# Altium footprint library LukaLIBRARY.PcbLib: 772 footprints (part 14 of 49)
Each footprint in its own frame and in the unit in brackets; x right, y up, seen from the top. Pads: shape width x height; smd on the part's side, far side on the other; paste and mask are expansions set on the pad; w line width, h text height; cw(c..) or ccw(c..) is an arc to the next point about the centre after c.
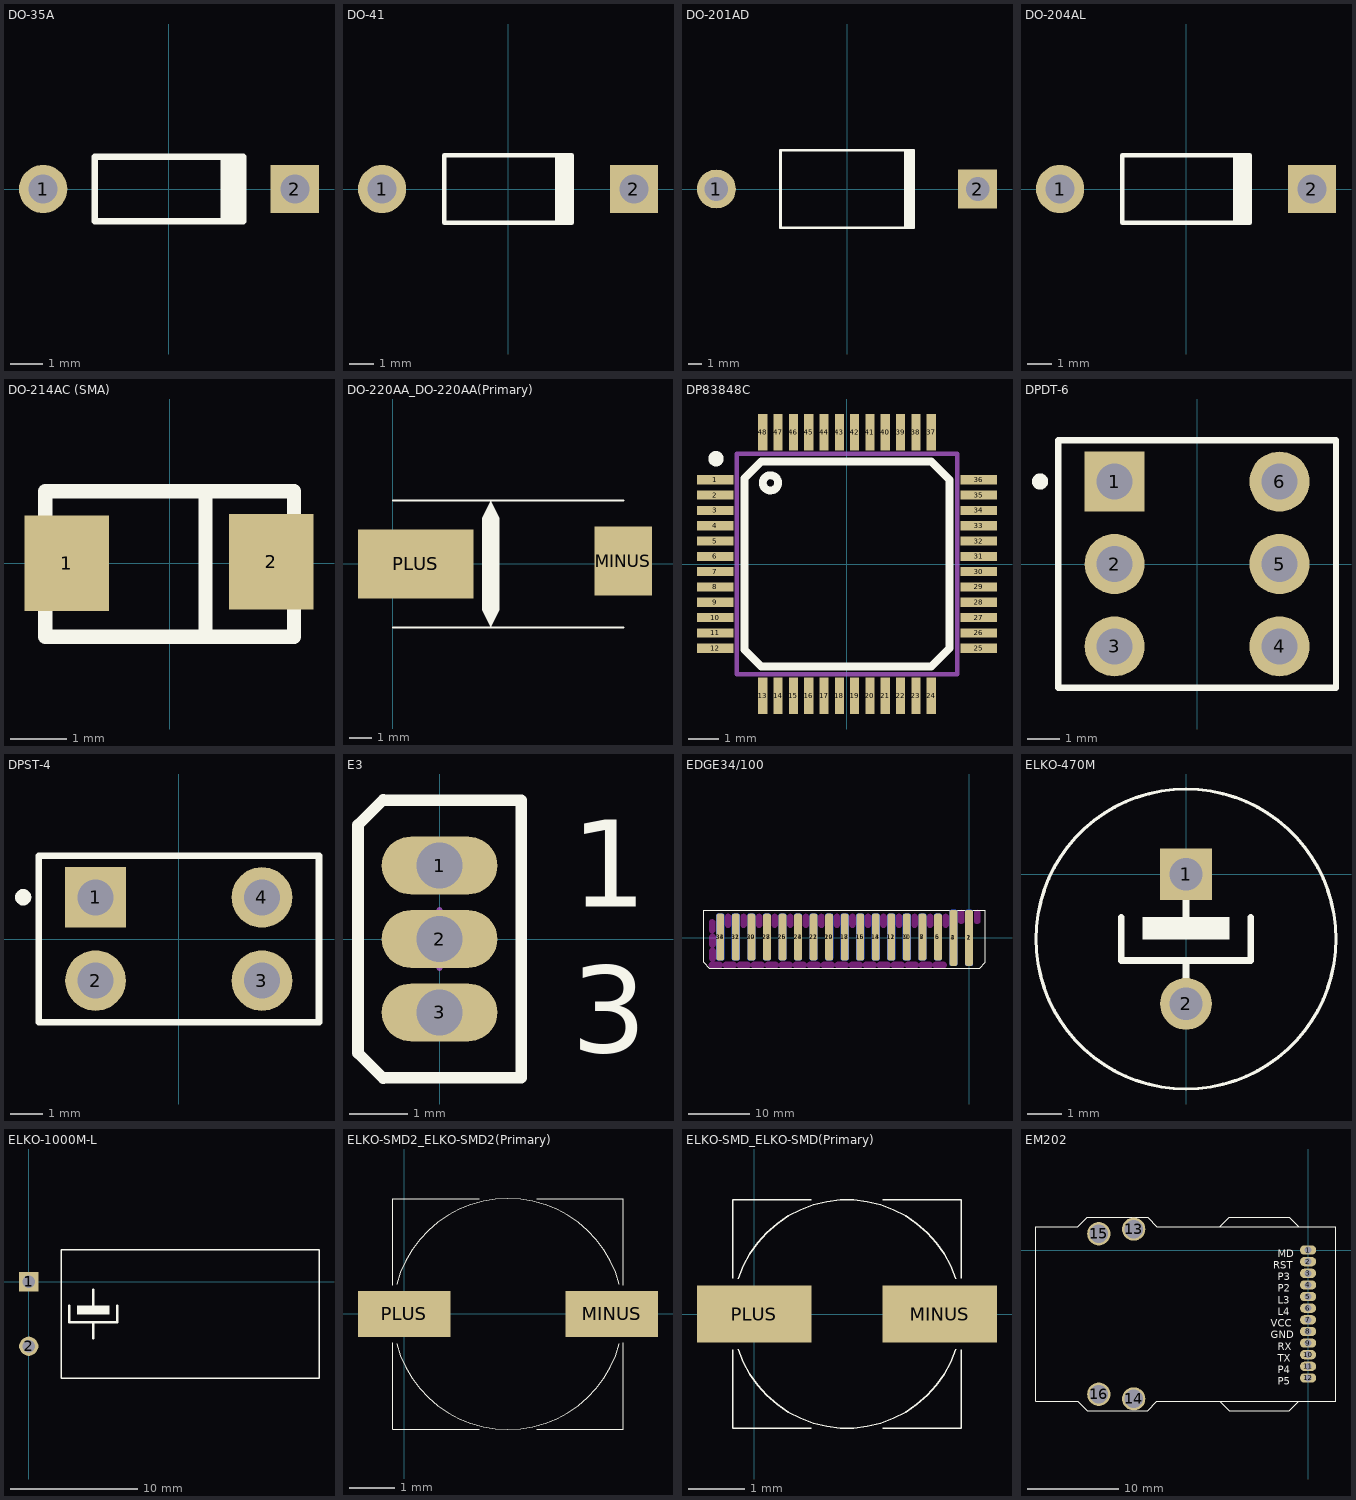
[diagram p13: the footprints below, top view; thin cyan lines are the x and y axes]

## DO-35A [mm] "Diode, Axial; Body 4.6 x 1.9 mm (LxDia. max), Lead Dia. 0.53 mm (max)"
height 2
pads (2):
  round 1.5 hole 0.9: 1(-3.9,0)
  rect 1.5x1.5 hole 0.9: 2(3.9,0)
Top Overlay:
  rectangle: 1.6,-1 2.4,1
  lines w0.2: 2.3,-1 -2.3,-1 -2.3,1 2.3,1

## DO-41 [mm] "Diode, Axial; Body 5.2 x 2.7 mm (LxDia. max), Lead Dia. 0.86 mm (max)"
height 2.8
pads (2):
  round 2 hole 1.2: 1(-5.23,0)
  rect 2x2 hole 1.2: 2(5.23,0)
Top Overlay:
  rectangle: 1.95,-1.4 2.75,1.4
  lines w0.2: 2.65,-1.4 -2.65,-1.4 -2.65,1.4 2.65,1.4

## DO-201AD [mm] "Diode, Axial; Body 9.5 x 5.6 mm (LxDia. max), Lead Dia. 1.32 mm (max)"
height 5.6
pads (2):
  round 2.8 hole 1.7: 1(-9.42,0)
  rect 2.8x2.8 hole 1.7: 2(9.42,0)
Top Overlay:
  rectangle: 4.1,-2.8 4.9,2.8
  lines w0.2: 4.8,-2.8 -4.8,-2.8 -4.8,2.8 4.8,2.8

## DO-204AL [mm] "Diode, Axial; Body 5.2 x 2.7 mm (LxDia. max), Lead Dia. 0.86 mm (max)"
height 2.7
pads (2):
  round 2 hole 1.2: 1(-5.23,0)
  rect 2x2 hole 1.2: 2(5.23,0)
Top Overlay:
  rectangle: 1.95,-1.4 2.75,1.4
  lines w0.2: 2.65,-1.4 -2.65,-1.4 -2.65,1.4 2.65,1.4

## DO-214AC (SMA) [mm]
pads (2):
  rect 1.5x1.7 smd: 1(-1.829,0) 2(1.803,0.025)
Top Overlay:
  lines w0.254: 0.635,-1.308 0.635,1.283 ; -2.21,-1.308 -2.21,1.283 2.21,1.283 2.21,-1.308 -2.21,-1.308

## DO-220AA_DO-220AA(Primary) [mil]
pads (2):
  rect 100x120 smd mask-1000: MINUS(400,5)
  rect 200x120 smd mask-1000: PLUS(40,0)
Top Overlay:
  region: 155,80 155,-80 170,-110 185,-80 185,80 170,110
  lines w3: 0,-110 400,-110 ; 0,110 400,110
Top Solder:
  region: 140,-60 140,60 -60,60 -60,-60
  region: 450,-55 450,65 350,65 350,-55

## DP83848C [mm] "Ethernet PHY LQFP48"
pads (48):
  rect 1.2x0.3 smd: 1(-4.3,2.75) 2(-4.3,2.25) 3(-4.3,1.75) 4(-4.3,1.25) 5(-4.3,0.75) 6(-4.3,0.25) 7(-4.3,-0.25) 8(-4.3,-0.75) 9(-4.3,-1.25) 10(-4.3,-1.75) 11(-4.3,-2.25) 12(-4.3,-2.75) 25(4.3,-2.75) 26(4.3,-2.25) 27(4.3,-1.75) 28(4.3,-1.25) 29(4.3,-0.75) 30(4.3,-0.25) 31(4.3,0.25) 32(4.3,0.75) 33(4.3,1.25) 34(4.3,1.75) 35(4.3,2.25) 36(4.3,2.75)
  rect 0.3x1.2 smd: 13(-2.75,-4.3) 14(-2.25,-4.3) 15(-1.75,-4.3) 16(-1.25,-4.3) 17(-0.75,-4.3) 18(-0.25,-4.3) 19(0.25,-4.3) 20(0.75,-4.3) 21(1.25,-4.3) 22(1.75,-4.3) 23(2.25,-4.3) 24(2.75,-4.3) 37(2.75,4.3) 38(2.25,4.3) 39(1.75,4.3) 40(1.25,4.3) 41(0.75,4.3) 42(0.25,4.3) 43(-0.25,4.3) 44(-0.75,4.3) 45(-1.25,4.3) 46(-1.75,4.3) 47(-2.25,4.3) 48(-2.75,4.3)
Top Overlay:
  circle w0.25: c-4.282,3.439 r0.125
  circle w0.254: c-2.5,2.65 r0.25
  lines w0.254: -3.35,-2.8 -3.35,2.8 -2.8,3.35 2.75,3.35 3.35,2.75 3.35,-2.75 2.75,-3.35 -2.8,-3.35 -3.35,-2.8
Mechanical 1:
  lines w0.15: -3.6,-3.6 -3.6,3.6 3.6,3.6 3.6,-3.6 -3.6,-3.6

## DPDT-6 [mm] "Switch; 6 Leads"
pads (6):
  rect 1.85x1.85 hole 1.1: 1(-2.54,2.54)
  round 1.85 hole 1.1: 2(-2.54,0) 3(-2.54,-2.54) 4(2.54,-2.54) 5(2.54,0) 6(2.54,2.54)
Top Overlay:
  circle w0.25: c-4.836,2.541 r0.125
  lines w0.2: -4.28,-3.81 4.28,-3.81 4.28,3.81 -4.28,3.81 -4.28,-3.81

## DPST-4 [mm] "Switch; 4 Leads"
pads (4):
  rect 1.85x1.85 hole 1.1: 1(-2.54,1.27)
  round 1.85 hole 1.1: 2(-2.54,-1.27) 3(2.54,-1.27) 4(2.54,1.27)
Top Overlay:
  circle w0.25: c-4.751,1.274 r0.125
  lines w0.2: -4.28,-2.54 4.28,-2.54 4.28,2.54 -4.28,2.54 -4.28,-2.54

## E3 [mm] "TO, Flat Index; 3 In-Line, Axial Leads; Body Dia. 4.6mm; Lead Dia. 0.5 mm (max)"
height 4.01
pads (3):
  oval 2x1 hole 0.8: 1(0,1.27) 2(0,0) 3(0,-1.27)
Top Overlay:
  lines w0.2: -0.97,-2.41 -1.41,-1.97 -1.41,1.97 -0.97,2.41 ; -0.97,-2.4 1.41,-2.4 1.41,2.4 -0.97,2.4
  text "3" at 2.275,-1.963 h1.5
  text "1" at 2.275,0.555 h1.5
Mechanical 15:
  lines w0.1: -0.5,0 0.5,0 ; 0,-0.5 0,0.5

## EDGE34/100 [mil]
pads (34):
  rrect50% 50x360 smd mask-1000: 1(0,0) 3(-100,0)
  rrect50% 50x360 smd far side mask-1000: 2(0,0) 4(-100,0)
  rrect50% 50x300 smd mask-1000: 5(-200,5) 7(-300,5) 9(-400,5) 11(-500,5) 13(-600,5) 15(-700,5) 17(-800,5) 19(-900,5) 21(-1000,5) 23(-1100,5) 25(-1200,5) 27(-1300,5) 29(-1400,5) 31(-1500,5) 33(-1600,5)
  rrect50% 50x300 smd far side mask-1000: 6(-200,5) 8(-300,5) 10(-400,5) 12(-500,5) 14(-600,5) 16(-700,5) 18(-800,5) 20(-900,5) 22(-1000,5) 24(-1100,5) 26(-1200,5) 28(-1300,5) 30(-1400,5) 32(-1500,5) 34(-1600,5)
Top Overlay:
  lines w3: -1705.51,-158.27 -1705.51,178.74 105.51,178.74 105.51,-158.27 70.08,-195.28 -1670.08,-195.28 -1705.51,-158.27
Top Solder:
  drawing of 17 lines, arcs and shapes, not listed
Bottom Solder:
  drawing of 17 lines, arcs and shapes, not listed
Multi-Layer keep-out:
  drawing of 37 lines, arcs and shapes, not listed

## ELKO-470M [mil]
pads (2):
  rect 60x60 hole 38 mask-1000: 1(0,0)
  round 60 hole 38 mask-1000: 2(0,-150)
Top Overlay:
  circle w3.94: c0,-75 r173.57
  region: 50,-50 -50,-50 -50,-75 50,-75
  lines w7.87: -75,-50 -75,-100 75,-100 75,-50 ; 0,-125 0,-100 ; 0,-50 0,-20
Top Solder:
  region: 0,-119.74 -7.83,-120.77 -15.13,-123.8 -21.4,-128.6 -26.2,-134.87 -29.23,-142.17 -30.26,-150 -29.23,-157.83 -26.2,-165.13 -21.4,-171.4 -15.13,-176.21 -7.83,-179.23 0,-180.26 7.83,-179.23 15.13,-176.21 21.4,-171.4 26.2,-165.13 29.23,-157.83 30.26,-150 29.23,-142.17 26.2,-134.87 21.4,-128.6 15.13,-123.8 7.83,-120.77
  region: -30,-30 30,-30 30,30 -30,30
Bottom Solder:
  region: 0,-119.74 -7.83,-120.77 -15.13,-123.8 -21.4,-128.6 -26.2,-134.87 -29.23,-142.17 -30.26,-150 -29.23,-157.83 -26.2,-165.13 -21.4,-171.4 -15.13,-176.21 -7.83,-179.23 0,-180.26 7.83,-179.23 15.13,-176.21 21.4,-171.4 26.2,-165.13 29.23,-157.83 30.26,-150 29.23,-142.17 26.2,-134.87 21.4,-128.6 15.13,-123.8 7.83,-120.77
  region: -30,-30 30,-30 30,30 -30,30

## ELKO-1000M-L [mil]
pads (2):
  rect 60x60 hole 38 mask-1000: 1(0,0)
  round 60 hole 38 mask-1000: 2(0,-200)
Top Overlay:
  region: 250,-75 150,-75 150,-100 250,-100
  lines w3.94: 100,-300 900,-300 900,100 100,100 100,-300
  lines w7.87: 125,-75 125,-125 275,-125 275,-75 ; 200,-175 200,-125 ; 200,-75 200,-25
Top Solder:
  region: -30,-30 30,-30 30,30 -30,30
  region: 0,-169.74 -7.83,-170.77 -15.13,-173.79 -21.4,-178.6 -26.2,-184.87 -29.23,-192.17 -30.26,-200 -29.23,-207.83 -26.2,-215.13 -21.4,-221.4 -15.13,-226.21 -7.83,-229.23 0,-230.26 7.83,-229.23 15.13,-226.21 21.4,-221.4 26.2,-215.13 29.23,-207.83 30.26,-200 29.23,-192.17 26.2,-184.87 21.4,-178.6 15.13,-173.79 7.83,-170.77
Bottom Solder:
  region: -30,-30 30,-30 30,30 -30,30
  region: 0,-169.74 -7.83,-170.77 -15.13,-173.79 -21.4,-178.6 -26.2,-184.87 -29.23,-192.17 -30.26,-200 -29.23,-207.83 -26.2,-215.13 -21.4,-221.4 -15.13,-226.21 -7.83,-229.23 0,-230.26 7.83,-229.23 15.13,-226.21 21.4,-221.4 26.2,-215.13 29.23,-207.83 30.26,-200 29.23,-192.17 26.2,-184.87 21.4,-178.6 15.13,-173.79 7.83,-170.77

## ELKO-SMD2_ELKO-SMD2(Primary) [mil]
pads (2):
  rect 80x40 smd: MINUS(180,0) PLUS(0,0)
Top Overlay:
  lines w1: -10,-25 -10,-100 65,-100 ; -10,25 -10,100 65,100 ; -6.59,-25.88 ccw(c90,0) 186.59,-25.88 ; -6.59,25.88 cw(c90,0) 186.59,25.88 ; 115,-100 190,-100 190,-25 ; 115,100 190,100 190,25

## ELKO-SMD_ELKO-SMD(Primary) [mil]
pads (2):
  rect 80x40 smd: MINUS(130,0) PLUS(0,0)
Top Overlay:
  lines w1: -15,-25 -15,-80 40,-80 ; -15,25 -15,80 40,80 ; -11.08,-24.72 ccw(c65,0) 141.08,-24.72 ; -11.08,24.72 cw(c65,0) 141.08,24.72 ; 90,-80 145,-80 145,-25 ; 90,80 145,80 145,25

## EM202 [mil]
pads (16):
  oval 70x40 hole 30 mask-1000: 1(0,0) 2(0,-50) 3(0,-100) 4(0,-150) 5(0,-200) 6(0,-250) 7(0,-300) 8(0,-350) 9(0,-400) 10(0,-450) 11(0,-500) 12(0,-550)
  round 100 hole 80: 13(-750,90) 14(-750,-640) 15(-900,70) 16(-900,-620)
Top Overlay:
  lines w3.94: -380,-650 -340,-690 -80,-690 -40,-650 ; -380,100 -340,140 -80,140 -40,100 ; -1170,-650 -990,-650 -950,-690 -690,-690 -650,-650 120,-650 120,-370 120,-40 120,100 -170,100 -540,100 -650,100 -690,140 -950,140 -990,100 -1170,100 -1170,-650
  text "GND" at -160,-380 h31.25
  text "TX" at -130,-480 h31.25
  text "RX" at -130,-430 h31.25
  text "VCC" at -160,-330 h31.25
  text "P4" at -130,-530 h31.25
  text "MD" at -130,-30 h31.25
  text "RST" at -150,-80 h31.25
  text "P3" at -130,-130 h31.25
  text "P2" at -130,-180 h31.25
  text "L3" at -130,-230 h31.25
  text "L4" at -130,-280 h31.25
  text "P5" at -130,-580 h31.25
Top Solder:
  drawing of 12 lines, arcs and shapes, not listed
Bottom Solder:
  drawing of 12 lines, arcs and shapes, not listed